# Altium footprint library 1.27MM_SMD_插针.PcbLib: 19 footprints (part 2 of 2)
Each footprint in its own frame and in the unit in brackets; x right, y up, seen from the top. Pads: shape width x height; smd on the part's side, far side on the other; paste and mask are expansions set on the pad; w line width, h text height; cw(c..) or ccw(c..) is an arc to the next point about the centre after c.
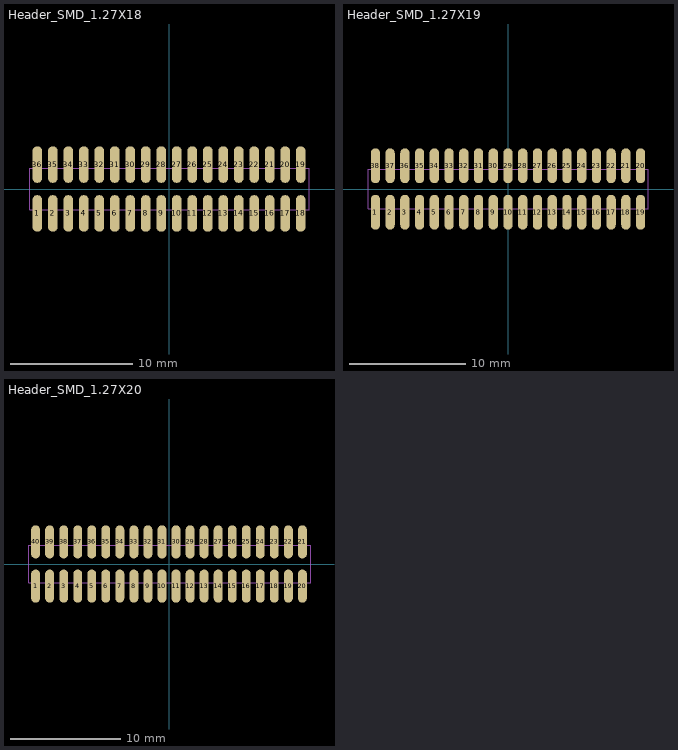
[diagram p1: the footprints below, top view; thin cyan lines are the x and y axes]

## Header_SMD_1.27X18 [mm]
pads (36):
  oval 0.8x3 smd: 1(-10.795,-2) 2(-9.525,-2) 3(-8.255,-2) 4(-6.985,-2) 5(-5.715,-2) 6(-4.445,-2) 7(-3.175,-2) 8(-1.905,-2) 9(-0.635,-2) 10(0.635,-2) 11(1.905,-2) 12(3.175,-2) 13(4.445,-2) 14(5.715,-2) 15(6.985,-2) 16(8.255,-2) 17(9.525,-2) 18(10.795,-2) 19(10.795,2) 20(9.525,2) 21(8.255,2) 22(6.985,2) 23(5.715,2) 24(4.445,2) 25(3.175,2) 26(1.905,2) 27(0.635,2) 28(-0.635,2) 29(-1.905,2) 30(-3.175,2) 31(-4.445,2) 32(-5.715,2) 33(-6.985,2) 34(-8.255,2) 35(-9.525,2) 36(-10.795,2)
Mechanical 15:
  lines w0.1: -11.43,-1.7 -11.43,1.7 11.5,1.7 11.5,-1.7 -11.43,-1.7
3D body "HEADER SMD 1.27X36.stp": height 6.4, standoff 0, extent -11.4,-2.752 11.46,2.752

## Header_SMD_1.27X19 [mm]
pads (38):
  oval 0.8x3 smd: 1(-11.43,-2) 2(-10.16,-2) 3(-8.89,-2) 4(-7.62,-2) 5(-6.35,-2) 6(-5.08,-2) 7(-3.81,-2) 8(-2.54,-2) 9(-1.27,-2) 10(0,-2) 11(1.27,-2) 12(2.54,-2) 13(3.81,-2) 14(5.08,-2) 15(6.35,-2) 16(7.62,-2) 17(8.89,-2) 18(10.16,-2) 19(11.43,-2) 20(11.43,2) 21(10.16,2) 22(8.89,2) 23(7.62,2) 24(6.35,2) 25(5.08,2) 26(3.81,2) 27(2.54,2) 28(1.27,2) 29(0,2) 30(-1.27,2) 31(-2.54,2) 32(-3.81,2) 33(-5.08,2) 34(-6.35,2) 35(-7.62,2) 36(-8.89,2) 37(-10.16,2) 38(-11.43,2)
Mechanical 15:
  lines w0.1: -12.065,-1.7 -12.065,1.7 12.1,1.7 12.1,-1.7 -12.065,-1.7
3D body "HEADER SMD 1.27X38.stp": height 6.4, standoff 0, extent -12.035,-2.752 12.095,2.752

## Header_SMD_1.27X20 [mm]
pads (40):
  oval 0.8x3 smd: 1(-12.065,-2) 2(-10.795,-2) 3(-9.525,-2) 4(-8.255,-2) 5(-6.985,-2) 6(-5.715,-2) 7(-4.445,-2) 8(-3.175,-2) 9(-1.905,-2) 10(-0.635,-2) 11(0.635,-2) 12(1.905,-2) 13(3.175,-2) 14(4.445,-2) 15(5.715,-2) 16(6.985,-2) 17(8.255,-2) 18(9.525,-2) 19(10.795,-2) 20(12.065,-2) 21(12.065,2) 22(10.795,2) 23(9.525,2) 24(8.255,2) 25(6.985,2) 26(5.715,2) 27(4.445,2) 28(3.175,2) 29(1.905,2) 30(0.635,2) 31(-0.635,2) 32(-1.905,2) 33(-3.175,2) 34(-4.445,2) 35(-5.715,2) 36(-6.985,2) 37(-8.255,2) 38(-9.525,2) 39(-10.795,2) 40(-12.065,2)
Mechanical 15:
  lines w0.1: -12.7,-1.7 -12.7,1.7 12.8,1.7 12.8,-1.7 -12.7,-1.7
3D body "HEADER SMD 1.27X40.stp": height 6.4, standoff 0, extent -12.67,-2.752 12.73,2.752